# Altium footprint library WR-TBL_Pluggable PCB Header.PcbLib: 719 footprints (part 20 of 45)
Each footprint in its own frame and in the unit in brackets; x right, y up, seen from the top. Pads: shape width x height; smd on the part's side, far side on the other; paste and mask are expansions set on the pad; w line width, h text height; cw(c..) or ccw(c..) is an arc to the next point about the centre after c.
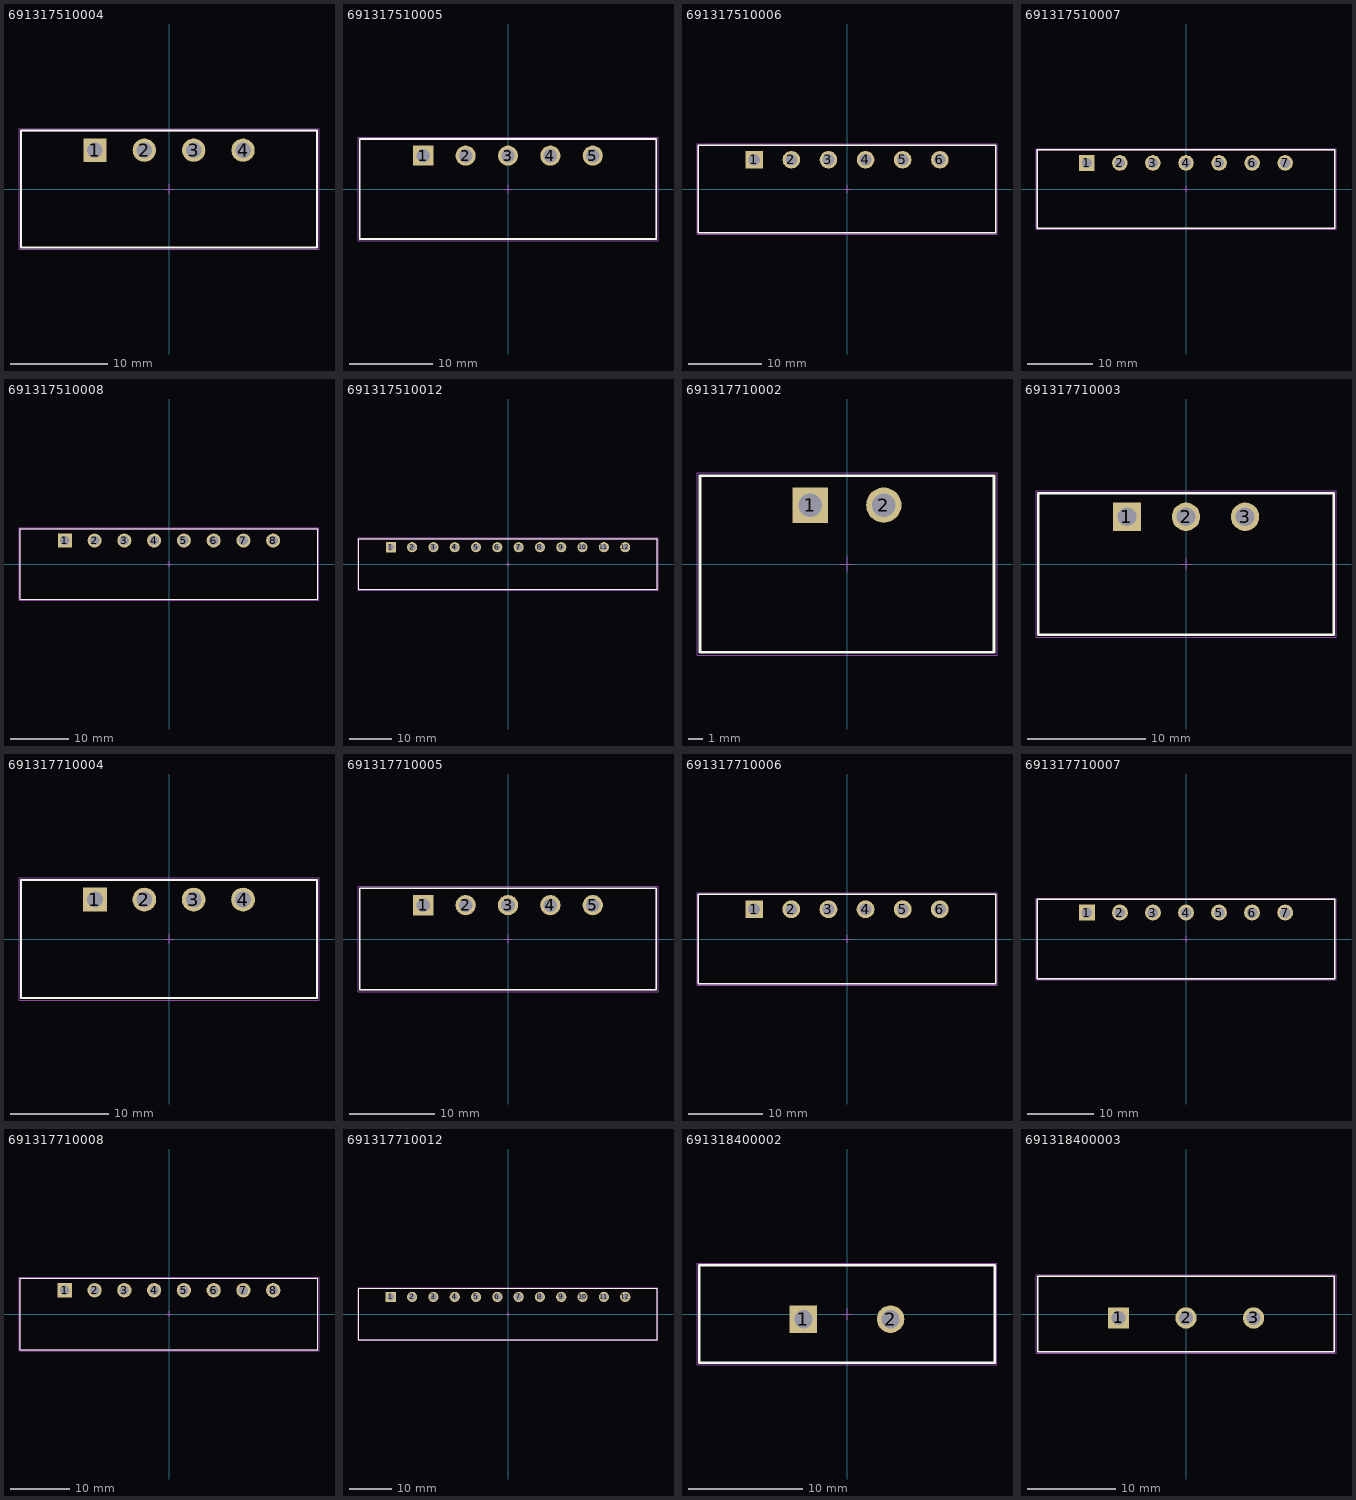
[diagram p19: the footprints below, top view; thin cyan lines are the x and y axes]

## 691317510004 [mm] "5,08mm - PCB Horizontal Closed With flanges - 04p"
height 8.5
pads (4):
  rect 2.4x2.4 hole 1.6: 1(-7.62,4)
  round 2.4 hole 1.6: 2(-2.54,4) 3(2.54,4) 4(7.62,4)
Top Overlay:
  lines w0.2: -15.24,-6 15.24,-6 15.24,6 -15.24,6 -15.24,-6
Mechanical 13:
  lines w0.1: -15.24,-6 -15.24,6 15.24,6 15.24,-6 -15.24,-6
Mechanical 15:
  lines w0.05: -0.5,0 0.5,0 ; 0,-0.5 0,0.5 ; -15.44,-6.2 -15.44,6.2 15.44,6.2 15.44,-6.2 -15.44,-6.2
3D body "691317510004.stp": height 8.55, standoff -3.45, extent -15.24,-6 15.24,6

## 691317510005 [mm] "5,08mm - PCB Horizontal Closed With flanges - 05p"
height 8.5
pads (5):
  rect 2.4x2.4 hole 1.6: 1(-10.16,4)
  round 2.4 hole 1.6: 2(-5.08,4) 3(0,4) 4(5.08,4) 5(10.16,4)
Top Overlay:
  lines w0.2: -17.78,-6 -17.78,6 17.78,6 17.78,-6 -17.78,-6
Mechanical 13:
  lines w0.1: -17.78,-6 17.78,-6 17.78,6 -17.78,6 -17.78,-6
Mechanical 15:
  lines w0.05: -0.5,0 0.5,0 ; 0,-0.5 0,0.5 ; -17.98,-6.2 17.98,-6.2 17.98,6.2 -17.98,6.2 -17.98,-6.2
3D body "691317510005.stp": height 8.55, standoff -3.45, extent -17.78,-6 17.78,6

## 691317510006 [mm] "5,08mm - PCB Horizontal Closed With flanges - 06p"
height 8.5
pads (6):
  rect 2.4x2.4 hole 1.6: 1(-12.7,4)
  round 2.4 hole 1.6: 2(-7.62,4) 3(-2.54,4) 4(2.54,4) 5(7.62,4) 6(12.7,4)
Top Overlay:
  lines w0.2: -20.32,-6 -20.32,6 20.32,6 20.32,-6 -20.32,-6
Mechanical 13:
  lines w0.1: -20.32,-6 20.32,-6 20.32,6 -20.32,6 -20.32,-6
Mechanical 15:
  lines w0.05: -0.5,0 0.5,0 ; 0,-0.5 0,0.5 ; -20.52,-6.2 20.52,-6.2 20.52,6.2 -20.52,6.2 -20.52,-6.2
3D body "691317510006.stp": height 8.55, standoff -3.45, extent -20.32,-6 20.32,6

## 691317510007 [mm] "5,08mm - PCB Horizontal Closed With flanges - 07p"
height 8.5
pads (7):
  rect 2.4x2.4 hole 1.6: 1(-15.24,4)
  round 2.4 hole 1.6: 2(-10.16,4) 3(-5.08,4) 4(0,4) 5(5.08,4) 6(10.16,4) 7(15.24,4)
Top Overlay:
  lines w0.2: -22.86,-6 -22.86,6 22.86,6 22.86,-6 -22.86,-6
Mechanical 13:
  lines w0.1: -22.86,-6 22.86,-6 22.86,6 -22.86,6 -22.86,-6
Mechanical 15:
  lines w0.05: -0.5,0 0.5,0 ; 0,-0.5 0,0.5 ; -23.06,-6.2 23.06,-6.2 23.06,6.2 -23.06,6.2 -23.06,-6.2
3D body "691317510007.stp": height 8.55, standoff -3.45, extent -22.86,-6 22.86,6

## 691317510008 [mm] "5,08mm - PCB Horizontal Closed With flanges - 08p"
height 8.5
pads (8):
  rect 2.4x2.4 hole 1.6: 1(-17.78,4)
  round 2.4 hole 1.6: 2(-12.7,4) 3(-7.62,4) 4(-2.54,4) 5(2.54,4) 6(7.62,4) 7(12.7,4) 8(17.78,4)
Top Overlay:
  lines w0.2: -25.4,-6 -25.4,6 25.4,6 25.4,-6 -25.4,-6
Mechanical 13:
  lines w0.1: -25.4,-6 25.4,-6 25.4,6 -25.4,6 -25.4,-6
Mechanical 15:
  lines w0.05: -0.5,0 0.5,0 ; 0,-0.5 0,0.5 ; -25.6,-6.2 25.6,-6.2 25.6,6.2 -25.6,6.2 -25.6,-6.2
3D body "691317510008.stp": height 8.55, standoff -3.45, extent -25.4,-6 25.4,6

## 691317510012 [mm] "5,08mm - PCB Horizontal Closed With flanges - 12p"
height 8.5
pads (12):
  rect 2.4x2.4 hole 1.6: 1(-27.94,4)
  round 2.4 hole 1.6: 2(-22.86,4) 3(-17.78,4) 4(-12.7,4) 5(-7.62,4) 6(-2.54,4) 7(2.54,4) 8(7.62,4) 9(12.7,4) 10(17.78,4) 11(22.86,4) 12(27.94,4)
Top Overlay:
  lines w0.2: -35.56,-6 -35.56,6 35.56,6 35.56,-6 -35.56,-6
Mechanical 13:
  lines w0.1: -35.56,-6 35.56,-6 35.56,6 -35.56,6 -35.56,-6
Mechanical 15:
  lines w0.05: -0.5,0 0.5,0 ; 0,-0.5 0,0.5 ; -35.76,-6.2 35.76,-6.2 35.76,6.2 -35.76,6.2 -35.76,-6.2
3D body "691317510012.stp": height 8.55, standoff -3.45, extent -35.56,-6 35.56,6

## 691317710002 [mm] "5.00mm - Closed Horizhontal PCB Header with Flanges - 02p"
height 8.5
pads (2):
  rect 2.4x2.4 hole 1.6: 1(-2.5,4)
  round 2.4 hole 1.6: 2(2.5,4)
Top Overlay:
  lines w0.2: -10,-6 10,-6 10,6 -10,6 -10,-6
Mechanical 13:
  lines w0.1: -10,-6 -10,6 10,6 10,-6 -10,-6
Mechanical 15:
  lines w0.05: -0.5,0 0.5,0 ; 0,-0.5 0,0.5 ; -10.2,-6.2 -10.2,6.2 10.2,6.2 10.2,-6.2 -10.2,-6.2
3D body "691317710002.stp": height 8.55, standoff -3.95, extent -10,-6 10,6

## 691317710003 [mm] "5.00mm - Closed Horizhontal PCB Header with Flanges - 03p"
height 8.5
pads (3):
  rect 2.4x2.4 hole 1.6: 1(-5,4)
  round 2.4 hole 1.6: 2(0,4) 3(5,4)
Top Overlay:
  lines w0.2: -12.5,-6 12.5,-6 12.5,6 -12.5,6 -12.5,-6
Mechanical 13:
  lines w0.1: -12.5,-6 -12.5,6 12.5,6 12.5,-6 -12.5,-6
Mechanical 15:
  lines w0.05: -0.5,0 0.5,0 ; 0,-0.5 0,0.5 ; -12.7,-6.2 -12.7,6.2 12.7,6.2 12.7,-6.2 -12.7,-6.2
3D body "691317710003.stp": height 8.55, standoff -3.95, extent -12.5,-6 12.5,6

## 691317710004 [mm] "5.00mm - Closed Horizhontal PCB Header with Flanges - 04p"
height 8.5
pads (4):
  rect 2.4x2.4 hole 1.6: 1(-7.5,4)
  round 2.4 hole 1.6: 2(-2.5,4) 3(2.5,4) 4(7.5,4)
Top Overlay:
  lines w0.2: -15,-6 -15,6 15,6 15,-6 -15,-6
Mechanical 13:
  lines w0.1: -15,-6 15,-6 15,6 -15,6 -15,-6
Mechanical 15:
  lines w0.05: -0.5,0 0.5,0 ; 0,-0.5 0,0.5 ; -15.2,-6.2 15.2,-6.2 15.2,6.2 -15.2,6.2 -15.2,-6.2
3D body "691317710004.stp": height 8.55, standoff -3.95, extent -15,-6 15,6

## 691317710005 [mm] "5.00mm - Closed Horizhontal PCB Header with Flanges - 05p"
height 8.5
pads (5):
  rect 2.4x2.4 hole 1.6: 1(-10,4)
  round 2.4 hole 1.6: 2(-5,4) 3(0,4) 4(5,4) 5(10,4)
Top Overlay:
  lines w0.2: -17.5,-6 17.5,-6 17.5,6 -17.5,6 -17.5,-6
Mechanical 13:
  lines w0.1: -17.5,-6 -17.5,6 17.5,6 17.5,-6 -17.5,-6
Mechanical 15:
  lines w0.05: -0.5,0 0.5,0 ; 0,-0.5 0,0.5 ; -17.7,-6.2 -17.7,6.2 17.7,6.2 17.7,-6.2 -17.7,-6.2
3D body "691317710005.stp": height 8.55, standoff -3.95, extent -17.5,-6 17.5,6

## 691317710006 [mm] "5.00mm - Closed Horizhontal PCB Header with Flanges - 06p"
height 8.5
pads (6):
  rect 2.4x2.4 hole 1.6: 1(-12.5,4)
  round 2.4 hole 1.6: 2(-7.5,4) 3(-2.5,4) 4(2.5,4) 5(7.5,4) 6(12.5,4)
Top Overlay:
  lines w0.2: -20,-6 20,-6 20,6 -20,6 -20,-6
Mechanical 13:
  lines w0.1: -20,-6 -20,6 20,6 20,-6 -20,-6
Mechanical 15:
  lines w0.05: -0.5,0 0.5,0 ; 0,-0.5 0,0.5 ; -20.2,-6.2 -20.2,6.2 20.2,6.2 20.2,-6.2 -20.2,-6.2
3D body "691317710006.stp": height 8.55, standoff -3.95, extent -20,-6 20,6

## 691317710007 [mm] "5.00mm - Closed Horizhontal PCB Header with Flanges - 07p"
height 8.5
pads (7):
  rect 2.4x2.4 hole 1.6: 1(-15,4)
  round 2.4 hole 1.6: 2(-10,4) 3(-5,4) 4(0,4) 5(5,4) 6(10,4) 7(15,4)
Top Overlay:
  lines w0.2: -22.5,-6 -22.5,6 22.5,6 22.5,-6 -22.5,-6
Mechanical 13:
  lines w0.1: -22.5,-6 22.5,-6 22.5,6 -22.5,6 -22.5,-6
Mechanical 15:
  lines w0.05: -0.5,0 0.5,0 ; 0,-0.5 0,0.5 ; -22.7,-6.2 22.7,-6.2 22.7,6.2 -22.7,6.2 -22.7,-6.2
3D body "691317710007.stp": height 8.55, standoff -3.95, extent -22.5,-6 22.5,6

## 691317710008 [mm] "5.00mm - Closed Horizhontal PCB Header with Flanges - 08p"
height 8.5
pads (8):
  rect 2.4x2.4 hole 1.6: 1(-17.5,4)
  round 2.4 hole 1.6: 2(-12.5,4) 3(-7.5,4) 4(-2.5,4) 5(2.5,4) 6(7.5,4) 7(12.5,4) 8(17.5,4)
Top Overlay:
  lines w0.2: -25,-6 -25,6 25,6 25,-6 -25,-6
Mechanical 13:
  lines w0.1: -25,-6 25,-6 25,6 -25,6 -25,-6
Mechanical 15:
  lines w0.05: -0.5,0 0.5,0 ; 0,-0.5 0,0.5 ; -25.2,-6.2 25.2,-6.2 25.2,6.2 -25.2,6.2 -25.2,-6.2
3D body "691317710008.stp": height 8.55, standoff -3.95, extent -25,-6 25,6

## 691317710012 [mm] "5.00mm - Closed Horizhontal PCB Header with Flanges - 12p"
height 8.5
pads (12):
  rect 2.4x2.4 hole 1.6: 1(-27.5,4)
  round 2.4 hole 1.6: 2(-22.5,4) 3(-17.5,4) 4(-12.5,4) 5(-7.5,4) 6(-2.5,4) 7(2.5,4) 8(7.5,4) 9(12.5,4) 10(17.5,4) 11(22.5,4) 12(27.5,4)
Top Overlay:
  lines w0.2: -35,-6 35,-6 35,6 -35,6 -35,-6
Mechanical 13:
  lines w0.1: -35,-6 -35,6 35,6 35,-6 -35,-6
Mechanical 15:
  lines w0.05: -0.5,0 0.5,0 ; 0,-0.5 0,0.5 ; -35.2,-6.2 -35.2,6.2 35.2,6.2 35.2,-6.2 -35.2,-6.2
3D body "691317710012.stp": height 8.55, standoff -3.95, extent -35,-6 35,6

## 691318400002 [mm] "7.62 mm - Closed Vertical PCB Header with Flanges - 2p"
height 12
pads (2):
  rect 2.4x2.4 hole 1.6: 1(-3.81,-0.45)
  round 2.4 hole 1.6: 2(3.81,-0.45)
Top Overlay:
  lines w0.2: -12.91,-4.25 -12.91,4.25 12.91,4.25 12.91,-4.25 -12.91,-4.25
Mechanical 13:
  lines w0.1: -12.91,-4.25 12.91,-4.25 12.91,4.25 -12.91,4.25 -12.91,-4.25
Mechanical 15:
  lines w0.05: -0.5,0 0.5,0 ; 0,-0.5 0,0.5 ; -13.11,-4.45 13.11,-4.45 13.11,4.45 -13.11,4.45 -13.11,-4.45
3D body "691318400002.stp": height 12.05, standoff -3.95, extent -12.91,-4.25 12.91,4.25

## 691318400003 [mm] "7.62 mm - Closed Vertical PCB Header with Flanges - 3p"
height 12
pads (3):
  rect 2.4x2.4 hole 1.6: 1(-7.62,-0.45)
  round 2.4 hole 1.6: 2(0,-0.45) 3(7.62,-0.45)
Top Overlay:
  lines w0.2: -16.72,-4.25 -16.72,4.25 16.72,4.25 16.72,-4.25 -16.72,-4.25
Mechanical 13:
  lines w0.1: -16.72,-4.25 16.72,-4.25 16.72,4.25 -16.72,4.25 -16.72,-4.25
Mechanical 15:
  lines w0.05: -0.5,0 0.5,0 ; 0,-0.5 0,0.5 ; -16.92,-4.45 16.92,-4.45 16.92,4.45 -16.92,4.45 -16.92,-4.45
3D body "691318400003.stp": height 12.05, standoff -3.95, extent -16.72,-4.25 16.72,4.25